# Altium footprint library MainFPs.PcbLib: 215 footprints (part 9 of 14)
Each footprint in its own frame and in the unit in brackets; x right, y up, seen from the top. Pads: shape width x height; smd on the part's side, far side on the other; paste and mask are expansions set on the pad; w line width, h text height; cw(c..) or ccw(c..) is an arc to the next point about the centre after c.
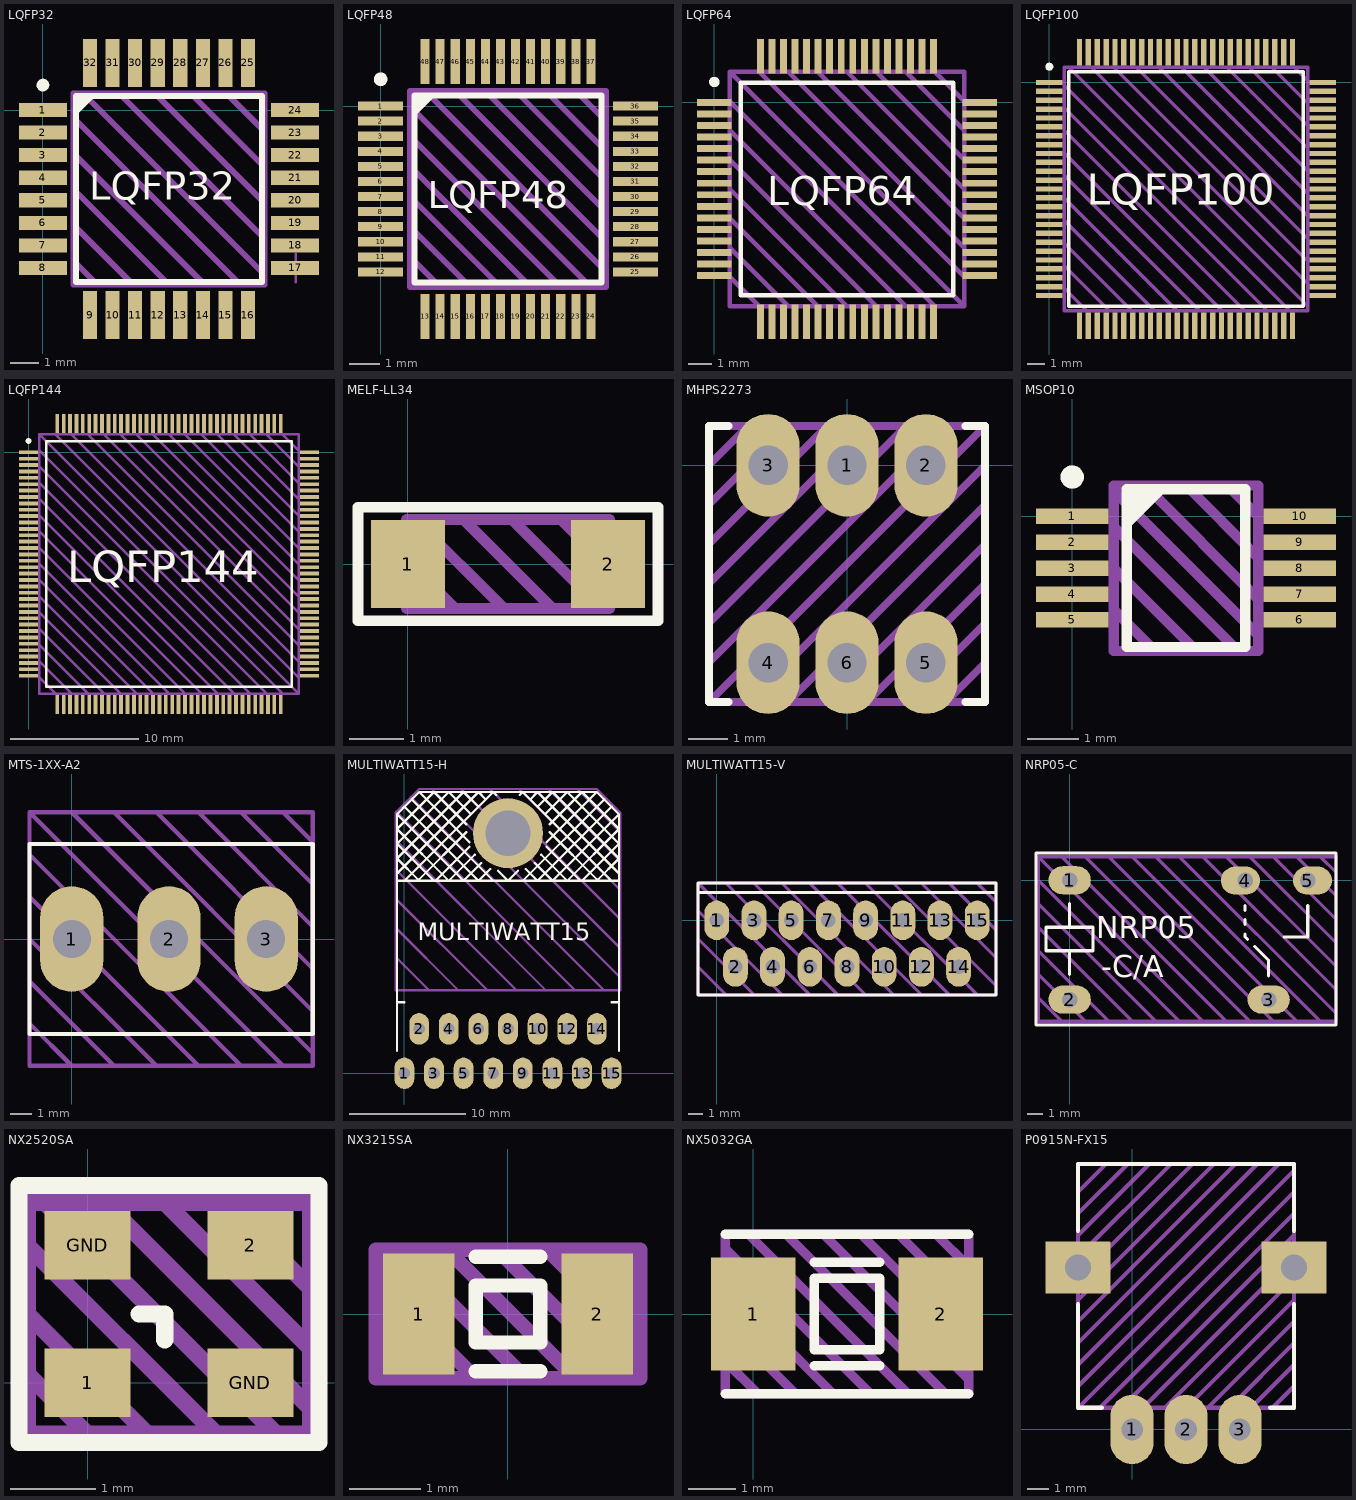
[diagram p8: the footprints below, top view; thin cyan lines are the x and y axes]

## LQFP32 [mm]
pads (32):
  rect 1.7x0.5 smd: 1(0,0) 2(0,-0.8) 3(0,-1.6) 4(0,-2.4) 5(0,-3.2) 6(0,-4) 7(0,-4.8) 8(0,-5.6) 17(8.95,-5.6) 18(8.95,-4.8) 19(8.95,-4) 20(8.95,-3.2) 21(8.95,-2.4) 22(8.95,-1.6) 23(8.95,-0.8) 24(8.95,0)
  rect 0.5x1.7 smd: 9(1.675,-7.275) 10(2.475,-7.275) 11(3.275,-7.275) 12(4.075,-7.275) 13(4.875,-7.275) 14(5.675,-7.275) 15(6.475,-7.275) 16(7.275,-7.275) 25(7.275,1.675) 26(6.475,1.675) 27(5.675,1.675) 28(4.875,1.675) 29(4.075,1.675) 30(3.275,1.675) 31(2.475,1.675) 32(1.675,1.675)
Top Overlay:
  circle w0.25: c0,0.889 r0.1
  region: 1.175,0.5 1.175,-0.188 1.863,0.5
  lines w0.2: 1.175,-6.1 1.175,0.5 7.775,0.5 7.775,-6.1 1.175,-6.1
  text "LQFP32" at 1.651,-3.175 h1
Top Draw:
  lines w0.2: 1.075,-5.34 1.935,-6.2 ; 1.075,-4.07 3.205,-6.2 ; 1.075,-2.8 4.475,-6.2 ; 1.075,-1.53 5.745,-6.2 ; 1.075,-0.26 7.015,-6.2 ; 1.427,0.6 7.875,-5.848 ; 2.697,0.6 7.875,-4.578 ; 3.967,0.6 7.875,-3.308 ; 5.237,0.6 7.875,-2.038 ; 6.507,0.6 7.875,-0.768 7.875,-1.022 ; 7.875,-2.038 7.875,-2.038 ; 1.075,-6.2 1.075,0.6 7.875,0.6 7.875,-6.2 1.075,-6.2
Top Info:
  text "'.Comment'" at 0.508,-9.144 h0.75
Mechanical 15:
  lines w0.1: 8.475,-5.6 9.475,-5.6 ; 8.975,-6.1 8.975,-5.1
3D body "LQFP322.step": height 1.6, standoff 0, extent -0.375,-7.65 9.325,2.05

## LQFP48 [mm]
height 1.6
pads (48):
  rect 1.5x0.3 smd mask+0.076: 1(0,0) 2(0,-0.5) 3(0,-1) 4(0,-1.5) 5(0,-2) 6(0,-2.5) 7(0,-3) 8(0,-3.5) 9(0,-4) 10(0,-4.5) 11(0,-5) 12(0,-5.5) 25(8.45,-5.5) 26(8.45,-5) 27(8.45,-4.5) 28(8.45,-4) 29(8.45,-3.5) 30(8.45,-3) 31(8.45,-2.5) 32(8.45,-2) 33(8.45,-1.5) 34(8.45,-1) 35(8.45,-0.5) 36(8.45,0)
  rect 0.3x1.5 smd mask+0.076: 13(1.475,-6.975) 14(1.975,-6.975) 15(2.475,-6.975) 16(2.975,-6.975) 17(3.475,-6.975) 18(3.975,-6.975) 19(4.475,-6.975) 20(4.975,-6.975) 21(5.475,-6.975) 22(5.975,-6.975) 23(6.475,-6.975) 24(6.975,-6.975) 37(6.975,1.475) 38(6.475,1.475) 39(5.975,1.475) 40(5.475,1.475) 41(4.975,1.475) 42(4.475,1.475) 43(3.975,1.475) 44(3.475,1.475) 45(2.975,1.475) 46(2.475,1.475) 47(1.975,1.475) 48(1.475,1.475)
Top Overlay:
  circle w0.25: c0,0.889 r0.1
  region: 1.125,0.35 1.125,-0.338 1.813,0.35
  lines w0.2: 1.125,-5.85 7.325,-5.85 7.325,0.35 1.125,0.35 1.125,-5.85
  text "LQFP48" at 1.558,-3.385 h0.9
Top Draw:
  lines w0.2: 0.975,-5 1.975,-6 2.475,-6 ; 0.975,-4 2.975,-6 3.225,-6 ; 0.975,-3 3.975,-6 4.225,-6 ; 0.975,-2 4.975,-6 5.225,-6 ; 0.975,-1 5.975,-6 6.225,-6 ; 0.975,0 6.975,-6 7.225,-6 ; 1.475,0.5 7.475,-5.5 7.475,-5.75 ; 1.725,0.5 2.475,0.5 7.475,-4.5 ; 3.475,0.5 7.475,-3.5 7.475,-4 ; 4.475,0.5 7.475,-2.5 7.475,-4.25 ; 5.475,0.5 7.475,-1.5 ; 6.475,0.5 7.475,-0.5 ; 0.975,-6 0.975,0.5 7.475,0.5 7.475,-6 0.975,-6
Top Info:
  text "'.Comment'" at -0.22,-9.227 h1
3D body "LQFP48.step": height 1.6, standoff 0, extent -0.275,-7.25 8.725,1.75

## LQFP64 [mm]
height 1.6
pads (64):
  rect 1.5x0.3 smd: 1(0,0) 2(0,-0.5) 3(0,-1) 4(0,-1.5) 5(0,-2) 6(0,-2.5) 7(0,-3) 8(0,-3.5) 9(0,-4) 10(0,-4.5) 11(0,-5) 12(0,-5.5) 13(0,-6) 14(0,-6.5) 15(0,-7) 16(0,-7.5) 33(11.5,-7.5) 34(11.5,-7) 35(11.5,-6.5) 36(11.5,-6) 37(11.5,-5.5) 38(11.5,-5) 39(11.5,-4.5) 40(11.5,-4) 41(11.5,-3.5) 42(11.5,-3) 43(11.5,-2.5) 44(11.5,-2) 45(11.5,-1.5) 46(11.5,-1) 47(11.5,-0.5) 48(11.5,0)
  rect 0.3x1.5 smd: 17(2,-9.5) 18(2.5,-9.5) 19(3,-9.5) 20(3.5,-9.5) 21(4,-9.5) 22(4.5,-9.5) 23(5,-9.5) 24(5.5,-9.5) 25(6,-9.5) 26(6.5,-9.5) 27(7,-9.5) 28(7.5,-9.5) 29(8,-9.5) 30(8.5,-9.5) 31(9,-9.5) 32(9.5,-9.5) 49(9.5,2) 50(9,2) 51(8.5,2) 52(8,2) 53(7.5,2) 54(7,2) 55(6.5,2) 56(6,2) 57(5.5,2) 58(5,2) 59(4.5,2) 60(4,2) 61(3.5,2) 62(3,2) 63(2.5,2) 64(2,2)
Top Overlay:
  circle w0.25: c0,0.889 r0.1
  lines w0.2: 1.15,-8.35 10.35,-8.35 10.35,0.85 1.15,0.85 1.15,-8.35
  text "LQFP64" at 2.286,-4.445 h1.25
Top Draw:
  lines w0.2: 0.67,-7.56 1.94,-8.83 0.67,-8.83 ; 0.67,-6.29 3.21,-8.83 ; 0.67,-5.02 4.48,-8.83 5.75,-8.83 0.67,-3.75 ; 0.67,-2.48 7.02,-8.83 8.29,-8.83 0.67,-1.21 ; 0.67,0.06 9.56,-8.83 ; 1.94,1.33 10.83,-7.56 10.83,-6.29 ; 3.21,1.33 10.83,-6.29 ; 4.48,1.33 10.83,-5.02 ; 5.75,1.33 10.83,-3.75 10.83,-5.02 ; 7.02,1.33 10.83,-2.48 ; 8.29,1.33 10.83,-1.21 10.83,-2.48 ; 9.56,1.33 10.83,0.06 ; 0.67,-8.83 0.67,1.33 ; 0.67,-8.83 10.83,-8.83 ; 0.67,1.33 10.83,1.33 10.83,-8.83 ; 0.67,1.33 10.83,-8.83 ; 10.83,-6.29 10.83,-5.02 ; 10.83,-5.02 10.83,-2.48
Top Info:
  text "'.Comment'" at 0.762,-11.684 h1
3D body "QFP127P600-8N.step": height 1.6, standoff 0, extent -0.25,-9.75 11.75,2.25

## LQFP100 [mm]
height 1.6
pads (100):
  rect 1.5x0.3 smd: 1(0,0) 2(0,-0.5) 3(0,-1) 4(0,-1.5) 5(0,-2) 6(0,-2.5) 7(0,-3) 8(0,-3.5) 9(0,-4) 10(0,-4.5) 11(0,-5) 12(0,-5.5) 13(0,-6) 14(0,-6.5) 15(0,-7) 16(0,-7.5) 17(0,-8) 18(0,-8.5) 19(0,-9) 20(0,-9.5) 21(0,-10) 22(0,-10.5) 23(0,-11) 24(0,-11.5) 25(0,-12) 51(15.4,-12) 52(15.4,-11.5) 53(15.4,-11) 54(15.4,-10.5) 55(15.4,-10) 56(15.4,-9.5) 57(15.4,-9) 58(15.4,-8.5) 59(15.4,-8) 60(15.4,-7.5) 61(15.4,-7) 62(15.4,-6.5) 63(15.4,-6) 64(15.4,-5.5) 65(15.4,-5) 66(15.4,-4.5) 67(15.4,-4) 68(15.4,-3.5) 69(15.4,-3) 70(15.4,-2.5) 71(15.4,-2) 72(15.4,-1.5) 73(15.4,-1) 74(15.4,-0.5) 75(15.4,0)
  rect 0.3x1.5 smd: 26(1.7,-13.7) 27(2.2,-13.7) 28(2.7,-13.7) 29(3.2,-13.7) 30(3.7,-13.7) 31(4.2,-13.7) 32(4.7,-13.7) 33(5.2,-13.7) 34(5.7,-13.7) 35(6.2,-13.7) 36(6.7,-13.7) 37(7.2,-13.7) 38(7.7,-13.7) 39(8.2,-13.7) 40(8.7,-13.7) 41(9.2,-13.7) 42(9.7,-13.7) 43(10.2,-13.7) 44(10.7,-13.7) 45(11.2,-13.7) 46(11.7,-13.7) 47(12.2,-13.7) 48(12.7,-13.7) 49(13.2,-13.7) 50(13.7,-13.7) 76(13.7,1.7) 77(13.2,1.7) 78(12.7,1.7) 79(12.2,1.7) 80(11.7,1.7) 81(11.2,1.7) 82(10.7,1.7) 83(10.2,1.7) 84(9.7,1.7) 85(9.2,1.7) 86(8.7,1.7) 87(8.2,1.7) 88(7.7,1.7) 89(7.2,1.7) 90(6.7,1.7) 91(6.2,1.7) 92(5.7,1.7) 93(5.2,1.7) 94(4.7,1.7) 95(4.2,1.7) 96(3.7,1.7) 97(3.2,1.7) 98(2.7,1.7) 99(2.2,1.7) 100(1.7,1.7)
Top Overlay:
  circle w0.25: c0,0.889 r0.1
  lines w0.2: 1.1,-12.6 14.3,-12.6 14.3,0.6 1.1,0.6 1.1,-12.6
  text "LQFP100" at 2.112,-6.889 h1.75
Top Draw:
  lines w0.2: 0.842,-11.588 2.112,-12.858 ; 0.842,-10.318 3.382,-12.858 ; 0.842,-9.048 4.652,-12.858 ; 0.842,-7.778 5.922,-12.858 ; 0.842,-6.508 7.192,-12.858 ; 0.842,-5.238 8.462,-12.858 ; 0.842,-3.968 9.732,-12.858 ; 0.842,-2.698 11.002,-12.858 ; 0.842,-1.428 12.272,-12.858 ; 0.842,-0.158 13.542,-12.858 ; 1.096,0.858 14.558,-12.604 ; 2.366,0.858 14.558,-11.334 ; 3.636,0.858 14.558,-10.064 ; 4.906,0.858 14.558,-8.794 ; 6.176,0.858 14.558,-7.524 ; 7.446,0.858 14.558,-6.254 ; 8.716,0.858 14.558,-4.984 ; 9.986,0.858 14.558,-3.714 ; 11.256,0.858 14.558,-2.444 ; 12.526,0.858 14.558,-1.174 ; 13.796,0.858 14.558,0.096 ; 0.842,-12.858 0.842,0.858 14.558,0.858 14.558,-12.858 0.842,-12.858
Top Info:
  text "'.Comment'" at 0.461,-16.16 h1.25
3D body "LQFP100.step": height 1.6, standoff 0, extent -0.3,-14 15.7,2

## LQFP144 [mm]
height 1.6
pads (144):
  rect 1.5x0.3 smd: 1(0,0) 2(0,-0.5) 3(0,-1) 4(0,-1.5) 5(0,-2) 6(0,-2.5) 7(0,-3) 8(0,-3.5) 9(0,-4) 10(0,-4.5) 11(0,-5) 12(0,-5.5) 13(0,-6) 14(0,-6.5) 15(0,-7) 16(0,-7.5) 17(0,-8) 18(0,-8.5) 19(0,-9) 20(0,-9.5) 21(0,-10) 22(0,-10.5) 23(0,-11) 24(0,-11.5) 25(0,-12) 26(0,-12.5) 27(0,-13) 28(0,-13.5) 29(0,-14) 30(0,-14.5) 31(0,-15) 32(0,-15.5) 33(0,-16) 34(0,-16.5) 35(0,-17) 36(0,-17.5) 73(22,-17.5) 74(22,-17) 75(22,-16.5) 76(22,-16) 77(22,-15.5) 78(22,-15) 79(22,-14.5) 80(22,-14) 81(22,-13.5) 82(22,-13) 83(22,-12.5) 84(22,-12) 85(22,-11.5) 86(22,-11) 87(22,-10.5) 88(22,-10) 89(22,-9.5) 90(22,-9) 91(22,-8.5) 92(22,-8) 93(22,-7.5) 94(22,-7) 95(22,-6.5) 96(22,-6) 97(22,-5.5) 98(22,-5) 99(22,-4.5) 100(22,-4) 101(22,-3.5) 102(22,-3) 103(22,-2.5) 104(22,-2) 105(22,-1.5) 106(22,-1) 107(22,-0.5) 108(22,0)
  rect 0.3x1.5 smd: 37(2.25,-19.75) 38(2.75,-19.75) 39(3.25,-19.75) 40(3.75,-19.75) 41(4.25,-19.75) 42(4.75,-19.75) 43(5.25,-19.75) 44(5.75,-19.75) 45(6.25,-19.75) 46(6.75,-19.75) 47(7.25,-19.75) 48(7.75,-19.75) 49(8.25,-19.75) 50(8.75,-19.75) 51(9.25,-19.75) 52(9.75,-19.75) 53(10.25,-19.75) 54(10.75,-19.75) 55(11.25,-19.75) 56(11.75,-19.75) 57(12.25,-19.75) 58(12.75,-19.75) 59(13.25,-19.75) 60(13.75,-19.75) 61(14.25,-19.75) 62(14.75,-19.75) 63(15.25,-19.75) 64(15.75,-19.75) 65(16.25,-19.75) 66(16.75,-19.75) 67(17.25,-19.75) 68(17.75,-19.75) 69(18.25,-19.75) 70(18.75,-19.75) 71(19.25,-19.75) 72(19.75,-19.75) 109(19.75,2.25) 110(19.25,2.25) 111(18.75,2.25) 112(18.25,2.25) 113(17.75,2.25) 114(17.25,2.25) 115(16.75,2.25) 116(16.25,2.25) 117(15.75,2.25) 118(15.25,2.25) 119(14.75,2.25) 120(14.25,2.25) 121(13.75,2.25) 122(13.25,2.25) 123(12.75,2.25) 124(12.25,2.25) 125(11.75,2.25) 126(11.25,2.25) 127(10.75,2.25) 128(10.25,2.25) 129(9.75,2.25) 130(9.25,2.25) 131(8.75,2.25) 132(8.25,2.25) 133(7.75,2.25) 134(7.25,2.25) 135(6.75,2.25) 136(6.25,2.25) 137(5.75,2.25) 138(5.25,2.25) 139(4.75,2.25) 140(4.25,2.25) 141(3.75,2.25) 142(3.25,2.25) 143(2.75,2.25) 144(2.25,2.25)
Top Overlay:
  circle w0.25: c0,0.889 r0.1
  lines w0.2: 1.4,-18.35 1.4,0.85 20.6,0.85 20.6,-18.35 1.4,-18.35
  text "LQFP144" at 3.048,-10.16 h2.5
Top Draw:
  lines w0.2: 0.84,-17.64 2.11,-18.91 ; 0.84,-16.37 3.38,-18.91 ; 0.84,-15.1 4.65,-18.91 ; 0.84,-13.83 5.92,-18.91 7.19,-18.91 ; 0.84,-12.56 7.19,-18.91 ; 0.84,-11.29 8.46,-18.91 11,-18.91 ; 0.84,-10.02 9.73,-18.91 ; 0.84,-8.75 11,-18.91 ; 0.84,-7.48 12.27,-18.91 ; 21.16,0.14 19.89,1.41 18.62,1.41 21.16,-1.13 21.16,-3.67 ; 0.84,1.41 21.16,-18.91 ; 0.84,1.41 0.84,-18.91 21.16,-18.91 ; 0.84,1.41 2.11,1.41 21.16,-17.64 21.16,-16.37 3.38,1.41 4.65,1.41 21.16,-15.1 21.16,-13.83 ; 0.84,1.41 21.16,1.41 21.16,-18.91 ; 7.19,-18.91 9.73,-18.91 ; 9.73,-18.91 12.27,-18.91 ; 11,-18.91 13.54,-18.91 ; 12.27,-18.91 13.54,-18.91 ; 13.54,-18.91 0.84,-6.21 0.84,-4.94 14.81,-18.91 16.08,-18.91 0.84,-3.67 0.84,-2.4 17.35,-18.91 18.62,-18.91 0.84,-1.13 0.84,0.14 19.89,-18.91 21.16,-18.91 ; 21.16,-13.83 21.16,-11.29 8.46,1.41 9.73,1.41 21.16,-10.02 21.16,-8.75 11,1.41 12.27,1.41 21.16,-7.48 21.16,-6.21 ; 21.16,-13.83 21.16,-12.56 7.19,1.41 5.92,1.41 21.16,-13.83 ; 21.16,-6.21 21.16,-3.67 ; 21.16,-6.21 21.16,-4.94 14.81,1.41 13.54,1.41 21.16,-6.21 ; 21.16,-3.67 21.16,-2.4 17.35,1.41 16.08,1.41 21.16,-3.67
Top Info:
  text "'.Comment'" at 0.508,-23.114 h2
3D body "LQFP144.step": height 1.6, standoff 0, extent 0,-19.75 22,2.25

## MELF-LL34 [mm]
pads (2):
  rect 1.37x1.62 smd: 1(0,0) 2(3.7,0)
Top Overlay:
  lines w0.2: -0.925,-1.05 4.625,-1.05 4.625,1.05 -0.925,1.05 -0.925,-1.05
Top Draw:
  lines w0.2: -0.025,0.075 0.875,-0.825 ; 0.125,0.825 1.775,-0.825 ; 1.025,0.825 2.675,-0.825 ; 1.925,0.825 3.575,-0.825 ; 2.825,0.825 3.725,-0.075 ; -0.025,-0.825 -0.025,0.825 3.725,0.825 3.725,-0.825 -0.025,-0.825
Top Info:
  text "'.Comment'" at -0.274,-1.842 h0.5
3D body "LL34_Zener.stp": height 1.6, standoff 0.01, extent 0,-0.797 3.7,0.797

## MHPS2273 [mm] "MHPS Series Key Switches"
pads (6):
  oval 1.6x2.6 hole 1: 1(0,0) 2(2,0) 3(-2,0) 4(-2,-5) 5(2,-5) 6(0,-5)
Top Overlay:
  lines w0.2: -3,-6 -3.5,-6 -3.5,1 -3,1 ; 3,-6 3.5,-6 3.5,1 3,1
Top Draw:
  lines w0.2: -3.5,-5 2.5,1 ; -3.5,-4 1.5,1 ; -3.5,-3 0.5,1 ; -3.5,-2 -0.5,1 ; -3.5,-1 -1.5,1 ; -3.5,0 -2.5,1 ; -2.5,-6 3.5,0 ; -1.5,-6 3.5,-1 ; -0.5,-6 3.5,-2 ; 0.5,-6 3.5,-3 ; 1.5,-6 3.5,-4 ; 2.5,-6 3.5,-5 ; -3.5,-6 -3.5,1 3.5,1 ; -3.5,-6 3.5,-6 3.5,1 ; -3.5,-6 3.5,1 ; 3.5,-5 3.5,-5 ; 3.5,-4 3.5,-4 ; 3.5,-3 3.5,-3 ; 3.5,0 3.5,0
Top Info:
  text "'.Comment'" at -4.249,-7.783 h1
3D body "MHPS2273.stp": height 12.5, standoff -3.5, extent -3.5,-6 3.5,1

## MSOP10 [mm] "Mini SO"
pads (10):
  rect 1.4x0.3 smd: 1(0,0) 2(0,-0.5) 3(0,-1) 4(0,-1.5) 5(0,-2) 6(4.4,-2) 7(4.4,-1.5) 8(4.4,-1) 9(4.4,-0.5) 10(4.4,0)
Top Overlay:
  circle w0.25: c0,0.762 r0.1
  region: 1.057,0.524 1.057,-0.27 1.851,0.524
  lines w0.2: 1.057,-2.524 1.057,0.524 3.343,0.524 3.343,-2.524 1.057,-2.524
Top Draw:
  lines w0.2: 0.8,-1.8 1.6,-2.6 ; 0.8,-1 2.4,-2.6 ; 0.8,-0.2 3.2,-2.6 ; 0.8,0.5 3.6,-2.3 ; 1.4,0.6 3.6,-1.6 ; 2.2,0.6 3.6,-0.8 ; 3,0.6 3.6,0 ; 0.8,-2.6 3.6,-2.6 3.6,0.6 0.8,0.6 0.8,-2.6
Top Info:
  text "'.Comment'" at 0.076,-3.324 h0.5
3D body "TSSOP50P490X110-10N.step": height 1.1, standoff 0, extent -0.25,-2.55 4.65,0.55

## MTS-1XX-A2 [mm] "Miniature Toggle Switch"
pads (3):
  oval 3x5 hole 1.8: 1(0,0) 2(4.6,0) 3(9.2,0)
Top Overlay:
  lines w0.2: -2,-4.5 -2,4.5 11.4,4.5 11.4,-4.5 -2,-4.5
Top Draw:
  lines w0.2: -2,-4 0,-6 ; -2,-2 2,-6 ; -2,0 4,-6 ; -2,2 6,-6 ; -2,4 8,-6 ; 0,6 11.4,-5.4 ; 2,6 11.4,-3.4 ; 4,6 11.4,-1.4 ; 6,6 11.4,0.6 ; 8,6 11.4,2.6 ; 10,-6 -2,6 ; 10,6 11.4,4.6 ; -2,6 11.4,6 11.4,-6 -2,-6 -2,6 ; 2,-6 2,-6
Top Info:
  text "'.Comment'" at -1.873,-8.175 h1.5
3D body "MTS-1xx-A2-blue.step": height 30.13, standoff -5.5, extent -2,-6 11.392,6

## MULTIWATT15-H [mm]
pads (16):
  oval 1.7x2.7 hole 1: 1(0,0) 2(1.27,3.81) 3(2.54,0) 4(3.81,3.81) 5(5.08,0) 6(6.35,3.81) 7(7.62,0) 8(8.89,3.81) 9(10.16,0) 10(11.43,3.81) 11(12.7,0) 12(13.97,3.81) 13(15.24,0) 14(16.51,3.81) 15(17.78,0)
  round 6 hole 3.9: ""(8.89,20.592)
Top Overlay:
  lines w0.2: -0.635,1.905 -0.635,6.35 -0.635,17.145 ; -0.635,6.096 0,6.096 ; -0.635,16.764 -0.635,17.145 ; -0.635,16.891 -0.635,16.51 18.415,16.51 18.415,16.891 18.415,19.431 18.415,20.701 18.415,21.971 ; -0.635,17.78 -0.635,18.161 -0.635,19.431 ; -0.635,21.971 -0.635,20.701 -0.635,19.685 ; -0.127,22.733 0.635,23.495 7.62,16.51 ; 0,16.51 7.62,24.13 ; 0,22.86 6.35,16.51 7.366,17.526 ; 1.27,16.51 -0.635,18.415 5.08,24.13 ; 1.27,16.637 5.334,20.701 ; 2.54,16.51 -0.635,19.685 ; 2.667,16.51 5.588,19.431 ; 5.334,21.336 2.54,24.13 ; 5.588,19.812 1.27,24.13 ; 5.715,22.225 3.81,24.13 ; 6.045,18.745 3.81,16.51 -0.635,20.955 2.54,24.13 ; 6.35,22.86 5.08,24.13 ; 6.604,18.034 5.08,16.51 -0.635,22.225 ; 6.985,23.495 6.35,24.13 ; 7.874,23.876 7.62,24.13 ; 8.03,17.37 8.89,16.51 9.75,17.37 ; 9.906,23.876 10.16,24.13 ; 10.16,16.51 17.145,23.495 ; 10.414,17.526 11.43,16.51 17.78,22.86 ; 10.795,23.495 11.43,24.13 ; 11.176,18.034 12.7,16.51 18.415,22.225 ; 11.43,22.86 12.7,24.13 ; 11.735,18.745 13.97,16.51 18.415,20.955 ; 12.065,22.225 13.97,24.13 ; 12.192,19.431 15.113,16.51 15.24,16.51 18.415,19.685 13.97,24.13 ; 12.192,19.812 16.51,24.13 ; 12.446,20.701 16.51,16.637 16.51,16.51 18.415,18.415 ; 12.446,21.336 15.24,24.13 ; 17.78,6.096 18.415,6.096 ; 17.78,16.51 10.16,24.13 ; 18.415,1.905 18.415,6.35 18.415,16.764 ; 18.415,18.161 18.415,16.764 ; 18.415,21.336 18.415,20.955 ; -0.635,17.145 -0.635,22.225 ; -0.635,17.145 6.35,24.13 ; -0.635,19.685 3.81,24.13 ; -0.635,22.225 1.27,24.13 ; 1.27,24.13 8.89,24.13 ; 1.27,24.13 3.81,24.13 ; 2.54,24.13 5.08,24.13 ; 3.81,24.13 6.35,24.13 ; 5.08,24.13 7.62,24.13 ; 6.35,24.13 8.89,24.13 ; 7.62,24.13 10.16,24.13 ; 8.89,24.13 16.51,24.13 ; 8.89,24.13 11.43,24.13 ; 10.16,24.13 12.7,24.13 ; 11.43,24.13 18.415,17.145 ; 11.43,24.13 13.97,24.13 ; 12.7,24.13 15.24,24.13 ; 12.7,24.13 18.415,18.415 ; 13.97,24.13 16.51,24.13 ; 15.24,24.13 18.415,20.955 ; 16.51,24.13 18.415,22.225 ; 18.415,16.764 18.415,17.145 ; 18.415,16.764 18.415,22.225 ; 18.415,17.145 18.415,18.415
  text "MULTIWATT15" at 1.143,11.43 h1.5
Top Draw:
  lines w0.2: -0.762,10 2.126,7.112 2.5,7.112 ; -0.762,12.5 4.626,7.112 5,7.112 ; -0.762,15 7.126,7.112 7.5,7.112 ; -0.762,17.5 9.626,7.112 10,7.112 ; -0.762,20 12.126,7.112 ; 0.126,7.112 1,7.112 ; 0.562,23.676 17.126,7.112 18.415,7.112 17.771,7.112 ; 1.75,24.384 2.354,24.384 18.542,8.196 18.542,7.5 ; 3.75,24.384 4.854,24.384 18.542,10.696 18.542,10 18.542,15.696 ; 7.5,24.384 9.854,24.384 ; 12.75,24.384 14.854,24.384 18.542,20.696 18.542,18.196 ; 14.774,7.112 15,7.112 ; 15.5,7.112 14.638,7.112 -0.682,22.432 ; 18.542,12.5 18.542,13.196 7.354,24.384 1.27,24.384 ; -0.682,22.432 -0.762,22.352 -0.762,7.112 18.542,7.112 18.542,22.352 16.51,24.384 1.27,24.384 ; -0.682,22.432 1.27,24.384 ; 9.854,24.384 18.542,15.696 ; 9.854,24.384 12.354,24.384 18.542,18.196 ; 12.126,7.112 12.5,7.112 12.126,7.112 ; 18.542,15.696 18.542,18.196
Top Info:
  text "'.Comment'" at -1.27,-5.08 h2.5
3D body: height 1.05, standoff 1, extent -0.127,11.176 0.127,11.938
3D body: height 1.05, standoff 1, extent 17.653,11.176 17.907,11.938
3D body: height 4, standoff 1, extent -0.635,7.112 18.415,15.748
3D body: height 2.5, standoff -2.5, extent 17.43,-0.355 18.13,9.645
3D body: height 2.5, standoff -2.5, extent 14.89,-0.355 15.59,9.645
3D body: height 2.5, standoff -2.5, extent 12.35,-0.355 13.05,9.645
3D body: height 2.5, standoff -2.5, extent 9.81,-0.355 10.51,9.645
3D body: height 2.5, standoff -2.5, extent 7.27,-0.355 7.97,9.645
3D body: height 2.5, standoff -2.5, extent 4.73,-0.355 5.43,9.645
3D body: height 2.5, standoff -2.5, extent 2.19,-0.355 2.89,9.645
3D body: height 2.5, standoff -2.5, extent -0.35,-0.355 0.35,9.645
3D body: height 2.5, standoff -2.5, extent 16.16,3.455 16.86,13.455
3D body: height 2.5, standoff -2.5, extent 13.62,3.455 14.32,13.455
3D body: height 2.5, standoff -2.5, extent 11.08,3.455 11.78,13.455
3D body: height 2.5, standoff -2.5, extent 8.54,3.455 9.24,13.455
3D body: height 2.5, standoff -2.5, extent 6,3.455 6.7,13.455
3D body: height 2.5, standoff -2.5, extent 3.46,3.455 4.16,13.455
3D body: height 2.5, standoff -2.5, extent 0.92,3.455 1.62,13.455
3D body: height 1, standoff 0.05, extent -0.635,7.112 18.415,15.748
3D body: height 1, standoff 0, extent -0.635,15.748 18.415,23.495
3D body: height 0.05, standoff 0, extent 8.89,8.255 17.463,15.748
3D body: height 0.05, standoff 0, extent 0.317,8.255 8.89,15.748

## MULTIWATT15-V [mm]
pads (15):
  oval 1.7x2.7 hole 1: 1(0,0) 2(1.27,-3.175) 3(2.54,0) 4(3.81,-3.175) 5(5.08,0) 6(6.35,-3.175) 7(7.62,0) 8(8.89,-3.175) 9(10.16,0) 10(11.43,-3.175) 11(12.7,0) 12(13.97,-3.175) 13(15.24,0) 14(16.51,-3.175) 15(17.78,0)
Top Overlay:
  lines w0.2: -1.27,1.905 -1.27,-5.08 19.05,-5.08 19.05,1.905 ; -1.27,1.905 19.05,1.905 ; -1.27,1.905 -1.27,2.54 19.05,2.54 19.05,1.905
Top Draw:
  lines w0.2: -1.27,-3.175 0.635,-5.08 ; -1.27,-1.27 2.54,-5.08 ; -1.27,0.635 4.445,-5.08 ; 0.635,2.54 8.255,-5.08 ; 2.54,2.54 10.16,-5.08 ; 4.445,2.54 12.065,-5.08 ; 6.35,-5.08 -1.27,2.54 ; 6.35,2.54 13.97,-5.08 ; 8.255,2.54 15.875,-5.08 ; 10.16,2.54 17.78,-5.08 ; 12.065,2.54 19.05,-4.445 ; 13.97,2.54 19.05,-2.54 ; 15.875,2.54 19.05,-0.635 ; 17.78,2.54 19.05,1.27 ; -1.27,2.54 -1.27,-5.08 19.05,-5.08 19.05,2.54 -1.27,2.54
Top Info:
  text "'.Comment'" at -1.27,-8.255 h2.5
3D body: height 20.02, standoff 12.28, extent -0.635,1.05 18.415,2.05
3D body: height 12.32, standoff 3.68, extent -0.635,1.095 18.415,2.045
3D body: height 12.32, standoff 3.68, extent -0.635,-1.905 18.415,1.095
3D body: height 12.32, standoff 4.82, extent 8.897,2 17.47,2.05
3D body: height 12.32, standoff 4.82, extent 0.325,2 8.897,2.05
3D body: height 10, standoff -3, extent 17.43,-0.25 18.13,0.25
3D body: height 7, standoff -3, extent 16.16,-3.429 16.86,0.259
3D body: height 8, standoff -3, extent 14.89,-0.25 15.59,0.25
3D body: height 7, standoff -3, extent 13.62,-3.429 14.32,0.259
3D body: height 8, standoff -3, extent 12.35,-0.25 13.05,0.25
3D body: height 7, standoff -3, extent 11.08,-3.429 11.78,0.259
3D body: height 8, standoff -3, extent 9.81,-0.25 10.51,0.25
3D body: height 7, standoff -3, extent 8.54,-3.429 9.24,0.259
3D body: height 8, standoff -3, extent 7.27,-0.25 7.97,0.25
3D body: height 7, standoff -3, extent 6,-3.429 6.7,0.259
3D body: height 8, standoff -3, extent 4.73,-0.25 5.43,0.25
3D body: height 7, standoff -3, extent 3.46,-3.429 4.16,0.259
3D body: height 8, standoff -3, extent 2.19,-0.25 2.89,0.25
3D body: height 7, standoff -3, extent 0.92,-3.429 1.62,0.259
3D body: height 10, standoff -3, extent -0.35,-0.25 0.35,0.25

## NRP05-C [mm]
pads (5):
  oval 2.7x1.8 hole 1: 1(0,0) 2(0,-7.62) 3(12.7,-7.62)
  oval 2.5x1.8 hole 1 copper offset -0.3,0: 4(11.2,-0.02)
  oval 2.5x1.8 hole 1 copper offset 0.3,0: 5(15.2,-0.02)
Top Overlay:
  lines w0.2: 0,-6 0,-4.5 ; 0,-3 0,-1.5 ; 11.2,-3.42 11.2,-3.52 11.2,-3.62 11.35,-3.77 ; 11.2,-2.82 11.2,-2.52 ; 11.2,-1.92 11.2,-1.62 ; 12.7,-6.12 12.7,-5.12 11.8,-4.22 ; 13.7,-3.62 14.2,-3.62 15.2,-3.62 15.2,-1.62 ; 11.8,-4.22 11.8,-4.22 ; -2.15,-9.25 17,-9.25 17,1.75 -2.15,1.75 -2.15,-9.25 ; -1.5,-4.5 -1.5,-3 1.5,-3 1.5,-4.5 -1.5,-4.5
  text "-C/A" at 2,-6.2 h1.4
  text "NRP05" at 1.7,-3.7 h1.4
Top Draw:
  lines w0.2: -2,-6 1,-9 1.5,-9 ; -2,-4.5 2.5,-9 ; -2,-3 4,-9 ; -2,-1.5 5.5,-9 6,-9 ; -2,0 7,-9 7.5,-9 ; -0.5,-9 -2,-7.5 ; -0.5,1.5 10,-9 10.5,-9 ; 1,1.5 11.5,-9 ; 2.5,1.5 13,-9 ; 4,1.5 14.5,-9 ; 5.5,1.5 16,-9 ; 7,1.5 17,-8.5 ; 8.5,1.5 17,-7 17,-7.5 ; 9,-9 8.5,-9 -2,1.5 ; 10,1.5 17,-5.5 17,-6 ; 11.5,1.5 17,-4 ; 13,1.5 17,-2.5 17,-3 ; 14.5,1.5 17,-1 17,-1.5 ; 16,1.5 17,0.5 ; -2,-7.5 -2,-7.5 ; -2,1.5 -2,-9 17,-9 17,1.5 -2,1.5 ; 2.5,-9 2.5,-9 ; 17,0.5 17,0.5
Top Info:
  text "'.Comment'" at -1.905,-12.065 h2
3D body: height 1, standoff -3, extent 12.55,-8.02 12.85,-7.22
3D body: height 1, standoff -3, extent 15.039,-0.425 15.339,0.375
3D body: height 1, standoff -3, extent 11.051,-0.425 11.351,0.375
3D body: height 1, standoff -3, extent -0.15,-8 0.15,-7.2
3D body: height 1, standoff -3, extent -0.15,-0.4 0.15,0.4
3D body: height 15.6, standoff 0.4, extent -2,-9 16.9,1.5
3D body: height 0.6, standoff 0, extent 0.5,-9 1.8,-8.7
3D body: height 0.6, standoff 0, extent 12.7,-9 14,-8.7
3D body: height 0.6, standoff 0, extent 12.7,1.2 14,1.5
3D body: height 0.6, standoff 0, extent 0.5,1.2 1.8,1.5

## NX2520SA [mm]
pads (4):
  rect 1x0.8 smd: 1(0,0) 2(1.9,1.6) GND(0,1.6) GND(1.9,0)
Top Overlay:
  lines w0.2: 0.6,0.8 0.9,0.8 0.9,0.5 ; -0.8,-0.7 2.7,-0.7 2.7,2.3 -0.8,2.3 -0.8,-0.7
Top Draw:
  lines w0.2: -0.7,0.1 0,-0.6 0.2,-0.6 ; -0.7,0.8 0.7,-0.6 1,-0.6 ; -0.7,1.6 1.5,-0.6 1.7,-0.6 ; -0.5,2.1 2.2,-0.6 2.4,-0.6 ; 0.2,2.1 2.6,-0.3 ; 0.9,2.1 2.6,0.4 2.6,0.2 ; 1.6,2.1 2.6,1.1 2.6,0.8 ; -0.7,-0.6 2.6,-0.6 2.6,2.1 -0.7,2.1 -0.7,-0.6
Top Info:
  text "'.Comment'" at -2.286,-1.837 h0.75
3D body: height 0.58, standoff 0, extent -0.275,-0.175 2.175,1.778
3D body: height 0.6, standoff 0.01, extent -0.253,-0.15 2.153,1.75
3D body: height 0.5, standoff 0.02, extent -0.3,-0.2 2.2,1.803

## NX3215SA [mm]
pads (2):
  rect 1x1.7 smd: 1(-1.25,0) 2(1.25,0)
Top Overlay:
  lines w0.2: -0.45,-0.8 0.45,-0.8 ; -0.45,0.8 0.45,0.8 ; -0.45,-0.4 0.45,-0.4 0.45,0.4 -0.45,0.4 -0.45,-0.4
Top Draw:
  lines w0.2: -1.85,-0.2 -1.15,-0.9 -0.95,-0.9 -1.35,-0.9 ; -1.85,0.5 -0.45,-0.9 -0.15,-0.9 ; -1.55,0.9 0.25,-0.9 0.45,-0.9 ; -0.85,0.9 0.95,-0.9 ; -0.15,0.9 1.65,-0.9 ; 0.55,0.9 1.85,-0.4 1.85,-0.6 ; 1.25,0.9 1.85,0.3 1.85,0 ; -1.85,-0.9 -1.85,0.9 1.85,0.9 1.85,-0.9 -1.85,-0.9
Top Info:
  text "'.Comment'" at -3.186,-2.037 h0.75
3D body: height 0.58, standoff 0.01, extent -1.45,-0.8 1.45,0.8
3D body: height 0.6, standoff 0.01, extent -1.425,-0.775 1.425,0.775
3D body: height 0.5, standoff 0, extent -1.475,-0.825 1.475,0.825

## NX5032GA [mm] "SMD Glass Sealing Crystals"
pads (2):
  rect 1.8x2.4 smd: 1(0,0) 2(4,0)
Top Overlay:
  lines w0.2: -0.6,-1.7 4.6,-1.7 ; -0.6,1.7 4.6,1.7 ; 1.3,-1.1 2.7,-1.1 ; 1.3,1.1 2.7,1.1 ; 1.3,-0.762 1.3,0.762 2.7,0.762 2.7,-0.762 1.3,-0.762
Top Draw:
  lines w0.2: -0.6,-1 0.1,-1.7 ; -0.6,-0.2 0.9,-1.7 ; -0.6,0.6 1.7,-1.7 ; -0.6,1.4 2.5,-1.7 ; -0.1,1.7 3.3,-1.7 ; 0.7,1.7 4.1,-1.7 ; 1.5,1.7 4.6,-1.4 ; 2.3,1.7 4.6,-0.6 ; 3.1,1.7 4.6,0.2 ; 3.9,1.7 4.6,1 ; -0.6,-1.7 4.6,-1.7 4.6,1.7 -0.6,1.7 -0.6,-1.7
Top Info:
  text "'.Comment'" at -1.186,-2.837 h0.75
3D body: height 0.8, standoff 0.6, extent -0.4,-1.5 4.4,1.5
3D body: height 0.6, standoff 0, extent -0.6,-1.7 4.6,1.7

## P0915N-FX15 [mm] "Model P09x Series Potentiometer"
pads (5):
  oval 2x3.2 hole 1: 1(0,0) 2(2.5,0) 3(5,0)
  rect 3x2.4 hole 1.2 square: ""(-2.5,7.5) ""(7.5,7.5)
Top Overlay:
  lines w0.2: -2.5,5.8 -2.5,1 -1.4,1 ; -2.5,9.2 -2.5,12.3 7.5,12.3 7.5,9.2 ; 6.4,1 7.5,1 7.5,5.8
Top Draw:
  lines w0.2: -2.5,2 7.5,12 ; -2.5,3 6.8,12.3 ; -2.5,4 5.8,12.3 ; -2.5,5 4.8,12.3 ; -2.5,6 3.8,12.3 ; -2.5,7 2.8,12.3 ; -2.5,8 1.8,12.3 ; -2.5,9 0.8,12.3 ; -2.5,10 -0.2,12.3 ; -2.5,11 -1.2,12.3 ; -1.5,1 7.5,10 ; -0.5,1 7.5,9 ; 0.5,1 7.5,8 ; 1.5,1 7.5,7 ; 2.5,1 7.5,6 ; 3.5,1 7.5,5 ; 4.5,1 7.5,4 ; 5.5,1 7.5,3 ; 6.5,1 7.5,2 ; 7.5,11 -2.5,1 ; -2.5,1 7.5,1 7.5,12.3 -2.5,12.3 -2.5,1
Top Info:
  text "'.Comment'" at -2.811,-3.429 h1.25
3D body "P0915N-EC15B.step": height 25, standoff -3.3, extent -3.548,-0.15 8.548,12.35